# Altium footprint library LimeMicroAltiumLib_pcbLib.PcbLib: 281 footprints (part 10 of 18)
Each footprint in its own frame and in the unit in brackets; x right, y up, seen from the top. Pads: shape width x height; smd on the part's side, far side on the other; paste and mask are expansions set on the pad; w line width, h text height; cw(c..) or ccw(c..) is an arc to the next point about the centre after c.
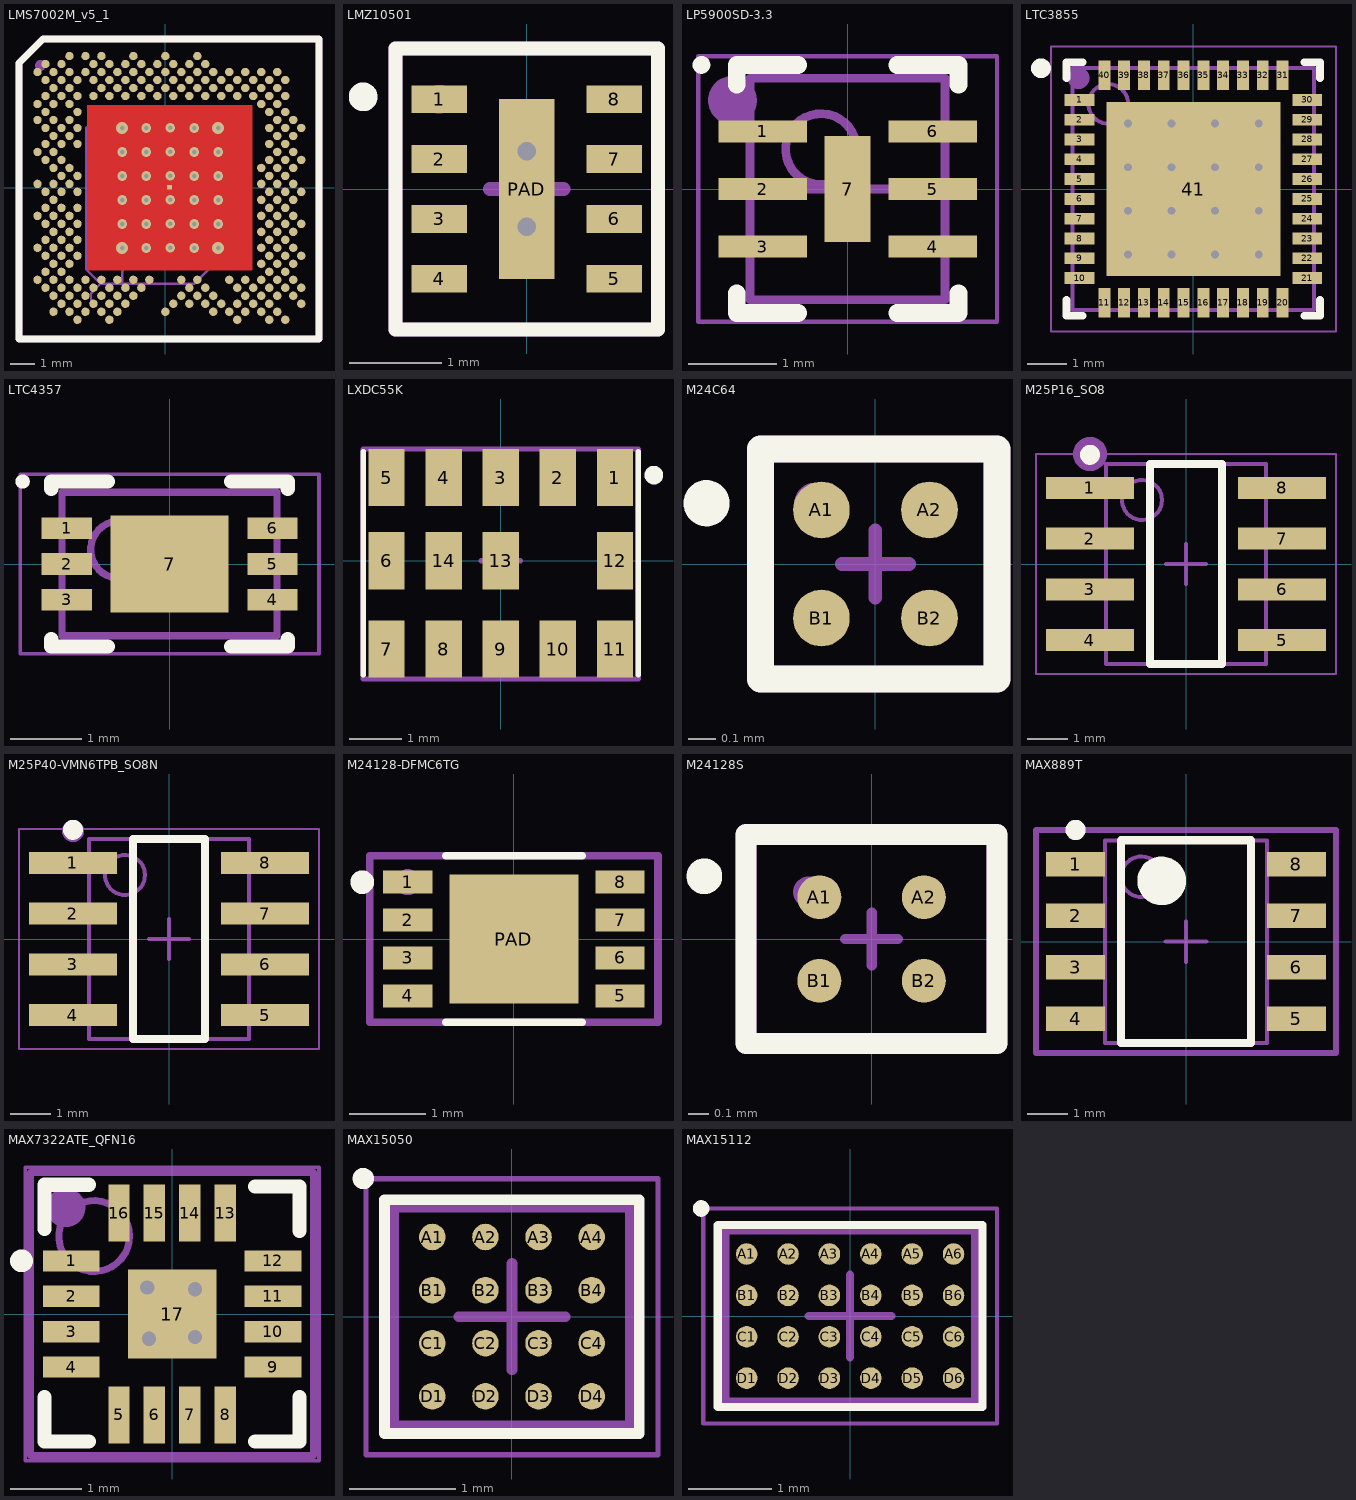
[diagram p9: the footprints below, top view; thin cyan lines are the x and y axes]

## LMS7002M_v5_1 [mm] "LMS7002 without AM2 pad (internally unconnected). center pad soldermask reduced to fit 0.18mm tolerance"
pads (261):
  round 0.35 smd mask+0: A5(-3.998,5.49) A7(-3.332,5.49) A9(-2.666,5.49) A13(-1.334,5.49) A17(-0.002,5.49) A21(1.33,5.49) AA1(-5.33,-1.17) AA3(-4.664,-1.17) AA5(-3.998,-1.17) AA29(3.994,-1.17) AA31(4.66,-1.17) AA33(5.326,-1.17) AB2(-4.997,-1.503) AB4(-4.331,-1.503) AB6(-3.665,-1.503) AB30(4.327,-1.503) AB32(4.993,-1.503) AB34(5.659,-1.503) AC3(-4.664,-1.836) AC5(-3.998,-1.836) AC29(3.994,-1.836) AC31(4.66,-1.836) AC33(5.326,-1.836) AD2(-4.997,-2.169) AD4(-4.331,-2.169) AD6(-3.665,-2.169) AD30(4.327,-2.169) AD32(4.993,-2.169) AE1(-5.33,-2.502) AE3(-4.664,-2.502) AE5(-3.998,-2.502) AE29(3.994,-2.502) AE31(4.66,-2.502) AE33(5.326,-2.502) AF2(-4.997,-2.835) AF4(-4.331,-2.835) AF6(-3.665,-2.835) AF30(4.327,-2.835) AF32(4.993,-2.835) AF34(5.659,-2.835) AG3(-4.664,-3.168) AG5(-3.998,-3.168) AG29(3.994,-3.168) AG31(4.66,-3.168) AG33(5.326,-3.168) AH2(-4.997,-3.501) AH4(-4.331,-3.501) AH30(4.327,-3.501) AH32(4.993,-3.501) AJ1(-5.33,-3.834) AJ3(-4.664,-3.834) AJ5(-3.998,-3.834) AJ7(-3.332,-3.834) AJ9(-2.666,-3.834) AJ11(-2,-3.834) AJ13(-1.334,-3.834) AJ15(-0.668,-3.834) AJ19(0.664,-3.834) AJ21(1.33,-3.834) AJ25(2.662,-3.834) AJ27(3.328,-3.834) AJ29(3.994,-3.834) AJ31(4.66,-3.834) AJ33(5.326,-3.834) AK2(-4.997,-4.167) AK4(-4.331,-4.167) AK6(-3.665,-4.167) AK8(-2.999,-4.167) AK10(-2.333,-4.167) AK12(-1.667,-4.167) AK14(-1.001,-4.167) AK20(0.997,-4.167) AK22(1.663,-4.167) AK26(2.995,-4.167) AK28(3.661,-4.167) AK30(4.327,-4.167) AK32(4.993,-4.167) AK34(5.659,-4.167) AL3(-4.664,-4.5) AL5(-3.998,-4.5) AL7(-3.332,-4.5) AL9(-2.666,-4.5) AL11(-2,-4.5) AL13(-1.334,-4.5) AL19(0.664,-4.5) AL21(1.33,-4.5) AL23(1.996,-4.5) AL27(3.328,-4.5) AL29(3.994,-4.5) AL31(4.66,-4.5) AL33(5.326,-4.5) AM4(-4.331,-4.833) AM6(-3.665,-4.833) AM8(-2.999,-4.833) AM10(-2.333,-4.833) AM12(-1.667,-4.833) AM18(0.331,-4.833) AM20(0.997,-4.833) AM22(1.663,-4.833) AM24(2.329,-4.833) AM26(2.995,-4.833) AM28(3.661,-4.833) AM30(4.327,-4.833) AM34(5.659,-4.833) AN3(-4.664,-5.166) AN5(-3.998,-5.166) AN7(-3.332,-5.166) AN9(-2.666,-5.166) AN11(-2,-5.166) AN17(-0.002,-5.166) AN23(1.996,-5.166) AN25(2.662,-5.166) AN27(3.328,-5.166) AN29(3.994,-5.166) AN31(4.66,-5.166) AP6(-3.665,-5.499) AP10(-2.333,-5.499) AP26(2.995,-5.499) AP30(4.327,-5.499) AP32(4.993,-5.499) B2(-4.997,5.157) B4(-4.331,5.157) B8(-2.999,5.157) B10(-2.333,5.157) B12(-1.667,5.157) B14(-1.001,5.157) B16(-0.335,5.157) B18(0.331,5.157) B20(0.997,5.157) B22(1.663,5.157) C1(-5.33,4.824) C3(-4.664,4.824) C5(-3.998,4.824) C7(-3.332,4.824) C9(-2.666,4.824) C11(-2,4.824) C13(-1.334,4.824) C15(-0.668,4.824) C17(-0.002,4.824) C19(0.664,4.824) C21(1.33,4.824) C23(1.996,4.824) C25(2.662,4.824) C27(3.328,4.824) C29(3.994,4.824) C31(4.66,4.824) D2(-4.997,4.491) D4(-4.331,4.491) D6(-3.665,4.491) D8(-2.999,4.491) D10(-2.333,4.491) D12(-1.667,4.491) D14(-1.001,4.491) D16(-0.335,4.491) D18(0.331,4.491) D20(0.997,4.491) D22(1.663,4.491) D24(2.329,4.491) D26(2.995,4.491) D28(3.661,4.491) D30(4.327,4.491) D32(4.993,4.491) E3(-4.664,4.158) E5(-3.998,4.158) E9(-2.666,4.158) E11(-2,4.158) E13(-1.334,4.158) E15(-0.668,4.158) E17(-0.002,4.158) E19(0.664,4.158) E21(1.33,4.158) E23(1.996,4.158) E25(2.662,4.158) E27(3.328,4.158) E29(3.994,4.158) E31(4.66,4.158) F2(-4.997,3.825) F4(-4.331,3.825) F6(-3.665,3.825) F8(-2.999,3.825) F10(-2.333,3.825) F12(-1.667,3.825) F14(-1.001,3.825) F16(-0.335,3.825) F18(0.331,3.825) F20(0.997,3.825) F22(1.663,3.825) F24(2.329,3.825) F26(2.995,3.825) F28(3.661,3.825) F30(4.327,3.825) F32(4.993,3.825) G1(-5.33,3.492) G3(-4.664,3.492) G5(-3.998,3.492) G29(3.994,3.492) G31(4.66,3.492) H2(-4.997,3.159) H6(-3.665,3.159) H30(4.327,3.159) H32(4.993,3.159) J1(-5.33,2.826) J3(-4.664,2.826) J5(-3.998,2.826) J31(4.66,2.826) J33(5.326,2.826) K2(-4.997,2.493) K4(-4.331,2.493) K6(-3.665,2.493) K30(4.327,2.493) K32(4.993,2.493) K34(5.659,2.493) L3(-4.664,2.16) L5(-3.998,2.16) L31(4.66,2.16) L33(5.326,2.16) M2(-4.997,1.827) M4(-4.331,1.827) M6(-3.665,1.827) M30(4.327,1.827) M32(4.993,1.827) N1(-5.33,1.494) N3(-4.664,1.494) N31(4.66,1.494) N33(5.326,1.494) P2(-4.997,1.161) P4(-4.331,1.161) P30(4.327,1.161) P32(4.993,1.161) P34(5.659,1.161) R3(-4.664,0.828) R5(-3.998,0.828) R29(3.994,0.828) R31(4.66,0.828) R33(5.326,0.828) T4(-4.331,0.495) T6(-3.665,0.495) T30(4.327,0.495) T32(4.993,0.495) U1(-5.33,0.162) U3(-4.664,0.162) U5(-3.998,0.162) U29(3.994,0.162) U31(4.66,0.162) U33(5.326,0.162) V2(-4.997,-0.171) V4(-4.331,-0.171) V6(-3.665,-0.171) V30(4.327,-0.171) V32(4.993,-0.171) V34(5.659,-0.171) W3(-4.664,-0.504) W29(3.994,-0.504) W31(4.66,-0.504) W33(5.326,-0.504) Y2(-4.997,-0.837) Y4(-4.331,-0.837) Y6(-3.665,-0.837) Y30(4.327,-0.837) Y32(4.993,-0.837)
  rect 0.2x0.2 smd: GND(0.175,0.025)
via 1.2,2.49 diameter 0.4 hole 0.2
via 1.2,1.49 diameter 0.4 hole 0.2
via 1.2,-0.51 diameter 0.4 hole 0.2
via 1.2,0.49 diameter 0.4 hole 0.2
via 1.2,-2.51 diameter 0.4 hole 0.2
via 1.2,-1.51 diameter 0.4 hole 0.2
via 2.2,2.49 diameter 0.5 hole 0.2
via 2.2,1.49 diameter 0.4 hole 0.2
via 2.2,-0.51 diameter 0.4 hole 0.2
via 2.2,0.49 diameter 0.4 hole 0.2
via 2.2,-2.51 diameter 0.5 hole 0.2
via 2.2,-1.51 diameter 0.4 hole 0.2
via -1.8,-1.51 diameter 0.4 hole 0.2
via -1.8,-2.51 diameter 0.5 hole 0.2
via -1.8,0.49 diameter 0.4 hole 0.2
via -1.8,-0.51 diameter 0.4 hole 0.2
via -1.8,1.49 diameter 0.4 hole 0.2
via -1.8,2.49 diameter 0.5 hole 0.2
via -0.8,-1.51 diameter 0.4 hole 0.2
via -0.8,-2.51 diameter 0.4 hole 0.2
via -0.8,0.49 diameter 0.4 hole 0.2
via -0.8,-0.51 diameter 0.4 hole 0.2
via -0.8,1.49 diameter 0.4 hole 0.2
via -0.8,2.49 diameter 0.4 hole 0.2
via 0.2,2.5 diameter 0.4 hole 0.2
via 0.2,1.5 diameter 0.4 hole 0.2
via 0.2,-0.5 diameter 0.4 hole 0.2
via 0.2,0.5 diameter 0.4 hole 0.2
via 0.2,-2.5 diameter 0.4 hole 0.2
via 0.2,-1.5 diameter 0.4 hole 0.2
Top Layer:
  rectangle: -3.275,-3.45 3.625,3.45
Top Overlay:
  lines w0.3: -6.1,-6.3 6.4,-6.3 6.4,6.2 -5.1,6.2 -6.1,5.2 -6.1,-6.3
Top Paste:
  drawing of 45 lines, arcs and shapes, not listed
Top Solder:
  rectangle: -3.275,-3.45 3.625,3.45
Mechanical 1:
  lines w0.1: -3.1,-4.7 -3.1,-4.4 -2.7,-4 ; -2.083,2.49 -1.8,2.49 ; -2,-2.71 -1.8,-2.51 ; -1.8,2.207 -1.8,2.49 ; -1.6,-2.71 -1.8,-2.51 ; 1.917,2.49 2.2,2.49 ; 2,-2.71 2.2,-2.51 ; 2.2,2.773 2.2,2.49 ; 2.4,-2.71 2.2,-2.51 ; -3.3,0.99 -3.3,2.5 -2.7,3.1 1.59,3.1 2.2,2.49 ; -3.3,0.99 -1.8,2.49 ; -3.3,0.99 -3.3,-3.4 -2.7,-4 ; -2.7,-4 -1.8,-4 ; -1.8,-4 1.2,-4 1.5,-3.7 2.2,-3 2.2,-2.51 ; -1.8,-4 -1.8,-2.51
  text "0.2mm/0.5mm hole/ring vias under   / pad to be left open (no metal cap)" at -6.6,-6.8 h0.35
Mechanical 15:
  circle w0.35: c-5.2,5.1 r0.05
  lines w0.1: -0.775,0 0,0 ; 0,-0.775 0,0 ; 0,0.775 0,0 ; 0.775,0 0,0
  lines w0.3: -6.1,-6.3 6.4,-6.3 6.4,6.2 -5.1,6.2 -6.1,5.2 -6.1,-6.3
  text "Footprint revision: r5.1" at -2.975,-6.075 h0.4
  text "Pad size = 0.35mm / Pad paste mask = 0.35mm / No AM2 pad" at -5.6,-4.25 h0.4
  text "1) paste/pad ratio ~60% / 2) 4 thermal pad vias  / without metal cap / 3) all other thermal pad  / vias with metal cap / 4) thermal pad reduced to / meet minimum 0.18mm soldermask / silver" at -5.775,-1.35 h0.4
  text ".Designator" at 0,0 h0.55
3D body "LMS7002M_11p5x11p5.STEP": height 0.97, standoff 0.03, extent -5.6,-5.75 5.9,5.75

## LMZ10501 [mm] "LMZ10501"
pads (9):
  rect 0.6x0.3 smd mask+0.07: 1(-0.95,0.975) 2(-0.95,0.325) 3(-0.95,-0.325) 4(-0.95,-0.975) 5(0.95,-0.975) 6(0.95,-0.325) 7(0.95,0.325) 8(0.95,0.975)
  rect 0.6x1.95 smd mask+0.07: PAD(0,0)
via 0,0.41 diameter 0.4 hole 0.2
via 0,-0.41 diameter 0.4 hole 0.2
Top Overlay:
  circle w0.2: c-1.775,1 r0.056
  lines w0.15: -1.425,-1.525 -1.425,1.525 1.425,1.525 1.425,-1.525 -1.425,-1.525
Mechanical 15:
  circle w0.2: c-0.95,0.975 r0.056
  lines w0.15: -0.4,0 0,0 ; 0,-0.4 0,0 ; 0,0.4 0,0 ; 0.4,0 0,0 ; -1.425,-1.525 -1.425,1.525 1.425,1.525 1.425,-1.525 -1.425,-1.525
  text ".Designator" at 0,0 h0.55
3D body: height 0.41, standoff 0, extent -1.313,-1.525 1.312,1.525
3D body: height 1.5, standoff 0.5, extent -0.8,-1 0.8,1

## LP5900SD-3.3 [mm] "SON, 6-Leads, Body 2,50x2,20mm, Pitch 0,65mm, Thermal Pad 1,20x0,52mm, IPC Medium Density"
height 0.8
pads (7):
  rect 1x0.25 smd mask+0.05: 1(-0.96,0.65) 2(-0.96,0) 3(-0.96,-0.65) 4(0.96,-0.65) 5(0.96,0) 6(0.96,0.65)
  rect 0.52x1.2 smd mask+0.05: 7(0,0)
Top Overlay:
  circle w0.1: c-1.65,1.4 r0.05
  lines w0.2: -1.25,-1.175 -1.25,-1.4 -0.56,-1.4 ; -1.25,1.175 -1.25,1.4 -0.56,1.4 ; 0.56,-1.4 1.25,-1.4 1.25,-1.175 ; 0.56,1.4 1.25,1.4 1.25,1.175
Mechanical 13:
  circle w0.1: c-0.3,0.45 r0.4
  lines w0.1: -1.1,-1.25 1.1,-1.25 1.1,1.25 -1.1,1.25 -1.1,-1.25
Mechanical 15:
  circle w0.35: c-1.3,1 r0.1
  lines w0.05: -1.685,-1.5 1.685,-1.5 1.685,1.5 -1.685,1.5 -1.685,-1.5
  lines w0.1: -0.5,0 0.5,0 ; 0,-0.5 0,0.5
  text ".Designator" at 0,0 h0.7
3D body: height 0.8, standoff 0.1, extent -1.1,-1.25 1.1,1.25

## LTC3855 [mm] "QFN, 40-Leads, Body 6,00x6,00mm, Pitch 0,50mm, Thermal Pad 4,40x4,40mm, IPC Medium Density"
height 0.8
pads (41):
  rect 0.75x0.3 smd mask+0.05: 1(-2.875,2.25) 2(-2.875,1.75) 3(-2.875,1.25) 4(-2.875,0.75) 5(-2.875,0.25) 6(-2.875,-0.25) 7(-2.875,-0.75) 8(-2.875,-1.25) 9(-2.875,-1.75) 10(-2.875,-2.25) 21(2.875,-2.25) 22(2.875,-1.75) 23(2.875,-1.25) 24(2.875,-0.75) 25(2.875,-0.25) 26(2.875,0.25) 27(2.875,0.75) 28(2.875,1.25) 29(2.875,1.75) 30(2.875,2.25)
  rect 0.3x0.75 smd mask+0.05: 11(-2.25,-2.875) 12(-1.75,-2.875) 13(-1.25,-2.875) 14(-0.75,-2.875) 15(-0.25,-2.875) 16(0.25,-2.875) 17(0.75,-2.875) 18(1.25,-2.875) 19(1.75,-2.875) 20(2.25,-2.875) 31(2.25,2.875) 32(1.75,2.875) 33(1.25,2.875) 34(0.75,2.875) 35(0.25,2.875) 36(-0.25,2.875) 37(-0.75,2.875) 38(-1.25,2.875) 39(-1.75,2.875) 40(-2.25,2.875)
  rect 4.4x4.4 smd mask+0.05: 41(0,0)
via -1.65,1.65 diameter 0.4 hole 0.2
via -0.55,1.65 diameter 0.4 hole 0.2
via 0.55,1.65 diameter 0.4 hole 0.2
via 1.65,1.65 diameter 0.4 hole 0.2
via -1.65,0.55 diameter 0.4 hole 0.2
via -0.55,0.55 diameter 0.4 hole 0.2
via 0.55,0.55 diameter 0.4 hole 0.2
via 1.65,0.55 diameter 0.4 hole 0.2
via -1.65,-0.55 diameter 0.4 hole 0.2
via -0.55,-0.55 diameter 0.4 hole 0.2
via 0.55,-0.55 diameter 0.4 hole 0.2
via 1.65,-0.55 diameter 0.4 hole 0.2
via -1.65,-1.65 diameter 0.4 hole 0.2
via -0.55,-1.65 diameter 0.4 hole 0.2
via 0.55,-1.65 diameter 0.4 hole 0.2
via 1.65,-1.65 diameter 0.4 hole 0.2
Top Overlay:
  circle w0.25: c-3.85,3.05 r0.125
  lines w0.2: -3.2,-2.8 -3.2,-3.2 -2.8,-3.2 ; -3.2,2.8 -3.2,3.2 -2.8,3.2 ; 2.8,-3.2 3.2,-3.2 3.2,-2.8 ; 2.8,3.2 3.2,3.2 3.2,2.8
Mechanical 13:
  circle w0.1: c-2.15,2.15 r0.5
  lines w0.1: -3.05,-3.05 -3.05,3.05 3.05,3.05 3.05,-3.05 -3.05,-3.05
Mechanical 15:
  circle w0.35: c-2.9,2.8 r0.1
  lines w0.05: -3.6,-3.6 -3.6,3.6 3.6,3.6 3.6,-3.6 -3.6,-3.6
  lines w0.1: -0.5,0 0.5,0 ; 0,-0.5 0,0.5
  text ".Designator" at 0,0 h0.7
3D body "User Library-QFN40.step": height 0.8, standoff 0, extent -3,-3 3,3

## LTC4357 [mm] "SON, 6-Leads, Body 2,00x3,00mm, Pitch 0,50mm, Thermal Pad 1,35x1,12mm, IPC Medium Density"
height 0.8
pads (7):
  rect 0.7x0.3 smd mask+0.05: 1(-1.435,0.5) 2(-1.435,0) 3(-1.435,-0.5) 4(1.435,-0.5) 5(1.435,0) 6(1.435,0.5)
  rect 1.65x1.35 smd mask+0.05: 7(0,0)
Top Overlay:
  circle w0.1: c-2.05,1.15 r0.05
  lines w0.2: -1.65,-1.05 -1.65,-1.15 -0.86,-1.15 ; -1.65,1.05 -1.65,1.15 -0.86,1.15 ; 0.86,-1.15 1.65,-1.15 1.65,-1.05 ; 0.86,1.15 1.65,1.15 1.65,1.05
Mechanical 13:
  circle w0.1: c-0.7,0.2 r0.4
  lines w0.1: -1.5,-1 1.5,-1 1.5,1 -1.5,1 -1.5,-1
Mechanical 15:
  lines w0.05: -2.085,-1.25 2.085,-1.25 2.085,1.25 -2.085,1.25 -2.085,-1.25
  lines w0.1: -0.5,0 0.5,0 ; 0,-0.5 0,0.5
  text ".Designator" at 0,-0.1 h0.7
3D body: height 0.8, standoff 0.2, extent -1.5,-1 1.5,1

## LXDC55K [mm] "LXDC55K"
pads (14):
  rect 0.7x1.1 smd mask+0.05: 1(2.2,1.6) 2(1.1,1.6) 3(0,1.6) 4(-1.1,1.6) 5(-2.2,1.6) 6(-2.2,0) 7(-2.2,-1.7) 8(-1.1,-1.7) 9(0,-1.7) 10(1.1,-1.7) 11(2.2,-1.7) 12(2.2,0) 13(0,0) 14(-1.1,0)
Top Overlay:
  circle w0.2: c2.95,1.65 r0.079
  lines w0.1: -2.65,-2.2 -2.65,2.1 ; 2.65,-2.2 2.65,2.1
Mechanical 15:
  circle w0.2: c2.2,1.625 r0.079
  lines w0.1: -0.375,0 0,0 ; 0,-0.375 0,0 ; 0,0.375 0,0 ; 0.375,0 0,0 ; -2.65,-2.275 -2.65,2.15 2.65,2.15 2.65,-2.275 -2.65,-2.275
  text ".Designator" at 0,0 h0.55
3D body: height 2.1, standoff 0, extent -2.85,-2.5 2.85,2.5

## M24C64 [mm]
pads (4):
  round 0.21 smd mask+0.05: A1(-0.2,0.2) A2(0.2,0.2) B1(-0.2,-0.2) B2(0.2,-0.2)
Top Overlay:
  circle w0.1: c-0.625,0.225 r0.035
  lines w0.1: -0.425,-0.425 -0.425,0.425 0.45,0.425 0.45,-0.425 -0.425,-0.425
Mechanical 15:
  circle w0.1: c-0.225,0.225 r0.025
  lines w0.05: -0.125,0 0,0 ; 0,-0.125 0,0 ; 0,0.125 0,0 ; 0.125,0 0,0
  lines w0.1: -0.425,-0.425 -0.425,0.425 0.45,0.425 0.45,-0.425 -0.425,-0.425
  text ".Designator" at 0,0 h0.55
3D body: height 0.33, standoff 0.32, extent -0.25,0.15 -0.15,0.25
3D body: height 0.32, standoff 0, extent -0.412,-0.35 0.413,0.35

## M25P16_SO8 [mm] "SOIC, 8-Leads, Body 4,90x3,90mm, Pitch 1,27mm, IPC Medium Density"
height 1.7
pads (8):
  rect 2.2x0.55 smd: 1(-2.4,1.905) 2(-2.4,0.635) 3(-2.4,-0.635) 4(-2.4,-1.905) 5(2.4,-1.905) 6(2.4,-0.635) 7(2.4,0.635) 8(2.4,1.905)
Top Overlay:
  circle w0.25: c-2.4,2.73 r0.125
  lines w0.2: -0.9,-2.5 0.9,-2.5 0.9,2.5 -0.9,2.5 -0.9,-2.5
Mechanical 13:
  circle w0.1: c-1.1,1.6 r0.5
  lines w0.1: -2,-2.5 2,-2.5 2,2.5 -2,2.5 -2,-2.5
Mechanical 15:
  circle w0.35: c-2.4,2.75 r0.25
  lines w0.05: -3.75,-2.75 3.75,-2.75 3.75,2.75 -3.75,2.75 -3.75,-2.75
  lines w0.1: -0.5,0 0.5,0 ; 0,-0.5 0,0.5
  text ".Designator" at 0,0 h0.7
3D body "CircuitWorks-SO-8.step": height 1.45, standoff 0, extent -2.889,-2.45 2.889,2.452

## M25P40-VMN6TPB_SO8N [mm] "SOIC, 8-Leads, Body 4,90x3,90mm, Pitch 1,27mm, IPC Medium Density"
height 1.7
pads (8):
  rect 2.2x0.55 smd: 1(-2.4,1.905) 2(-2.4,0.635) 3(-2.4,-0.635) 4(-2.4,-1.905) 5(2.4,-1.905) 6(2.4,-0.635) 7(2.4,0.635) 8(2.4,1.905)
Top Overlay:
  circle w0.25: c-2.4,2.73 r0.125
  lines w0.2: -0.9,-2.5 0.9,-2.5 0.9,2.5 -0.9,2.5 -0.9,-2.5
Mechanical 13:
  circle w0.1: c-1.1,1.6 r0.5
  lines w0.1: -2,-2.5 2,-2.5 2,2.5 -2,2.5 -2,-2.5
Mechanical 15:
  circle w0.35: c-2.4,2.7 r0.1
  lines w0.05: -3.75,-2.75 3.75,-2.75 3.75,2.75 -3.75,2.75 -3.75,-2.75
  lines w0.1: -0.5,0 0.5,0 ; 0,-0.5 0,0.5
  text ".Designator" at 0,0 h0.7
3D body "CircuitWorks-SO-8.step": height 1.45, standoff 0, extent -2.889,-2.45 2.889,2.452

## M24128-DFMC6TG [mm] "8-UFDFPN (2x3)"
pads (9):
  rect 0.65x0.3 smd mask+0.05: 1(-1.4,0.75) 2(-1.4,0.25) 3(-1.4,-0.25) 4(-1.4,-0.75) 5(1.4,-0.75) 6(1.4,-0.25) 7(1.4,0.25) 8(1.4,0.75)
  rect 1.7x1.7 smd mask+0.05: PAD(0,0)
Top Overlay:
  circle w0.2: c-2,0.75 r0.056
  lines w0.1: -0.9,-1.1 0.9,-1.1 ; -0.9,1.1 0.9,1.1
Mechanical 15:
  circle w0.2: c-1.4,0.75 r0.071
  lines w0.1: -0.3,0 0,0 ; 0,-0.3 0,0 ; 0,0.3 0,0 ; 0.3,0 0,0 ; -1.9,-1.1 1.9,-1.1 1.9,1.1 -1.9,1.1 -1.9,-1.1
  text ".Designator" at 0,0 h0.55
3D body "User Library-DFN-8-2.step": height 0.9, standoff 0, extent -1.523,-1.006 1.517,0.994

## M24128S [mm]
pads (4):
  round 0.21 smd mask+0.05: A1(-0.25,0.2) A2(0.25,0.2) B1(-0.25,-0.2) B2(0.25,-0.2)
Top Overlay:
  circle w0.1: c-0.8,0.3 r0.035
  lines w0.1: -0.6,-0.5 -0.6,0.5 0.6,0.5 0.6,-0.5 -0.6,-0.5
Mechanical 15:
  circle w0.1: c-0.3,0.225 r0.025
  lines w0.05: -0.125,0 0,0 ; 0,-0.125 0,0 ; 0,0.125 0,0 ; 0.125,0 0,0
  lines w0.1: -0.6,-0.5 0.6,-0.5 0.6,0.5 -0.6,0.5 -0.6,-0.5
  text ".Designator" at 0,0 h0.55
3D body: height 0.33, standoff 0.32, extent -0.25,0.15 -0.15,0.25
3D body: height 0.32, standoff 0, extent -0.412,-0.35 0.413,0.35

## MAX889T [mm] "SOIC, 8-Leads, Body 4,90x3,90mm, Pitch 1,27mm, IPC Medium Density"
height 1.75
pads (8):
  rect 1.45x0.6 smd: 1(-2.725,1.905) 2(-2.725,0.635) 3(-2.725,-0.635) 4(-2.725,-1.905) 5(2.725,-1.905) 6(2.725,-0.635) 7(2.725,0.635) 8(2.725,1.905)
Top Overlay:
  circle w0.6: c-0.6,1.5 r0.3
  circle w0.25: c-2.725,2.755 r0.125
  lines w0.2: -1.6,-2.5 1.6,-2.5 1.6,2.5 -1.6,2.5 -1.6,-2.5
Mechanical 13:
  circle w0.1: c-1.1,1.6 r0.5
  lines w0.1: -2,-2.5 2,-2.5 2,2.5 -2,2.5 -2,-2.5
Mechanical 15:
  circle w0.25: c-2.725,1.905 r0.125
  lines w0.1: -0.5,0 0.5,0 ; 0,-0.5 0,0.5
  lines w0.15: -3.7,-2.75 3.7,-2.75 3.7,2.75 -3.7,2.75 -3.7,-2.75
  text ".Designator" at -0.05,0 h0.7
3D body "SOIC-8.STEP": height 1.75, standoff 0, extent -3,-2.45 3,2.45

## MAX7322ATE_QFN16 [mm]
height 0.8
pads (17):
  rect 0.8x0.3 smd mask+0.05: 1(-1.425,0.75) 2(-1.425,0.25) 3(-1.425,-0.25) 4(-1.425,-0.75) 9(1.425,-0.75) 10(1.425,-0.25) 11(1.425,0.25) 12(1.425,0.75)
  rect 0.3x0.8 smd mask+0.05: 5(-0.75,-1.425) 6(-0.25,-1.425) 7(0.25,-1.425) 8(0.75,-1.425) 13(0.75,1.425) 14(0.25,1.425) 15(-0.25,1.425) 16(-0.75,1.425)
  rect 1.25x1.25 smd mask+0.05: 17(0,0)
via -0.35,0.375 diameter 0.4 hole 0.2
via 0.325,0.35 diameter 0.4 hole 0.2
via 0.325,-0.325 diameter 0.4 hole 0.2
via -0.325,-0.35 diameter 0.4 hole 0.2
Top Overlay:
  circle w0.25: c-2.125,0.75 r0.035
  lines w0.2: -1.8,-1.175 -1.8,-1.8 -1.175,-1.8 ; -1.8,1.2 -1.8,1.825 -1.175,1.825 ; 1.175,-1.8 1.8,-1.8 1.8,-1.175 ; 1.175,1.8 1.8,1.8 1.8,1.175
Mechanical 13:
  circle w0.1: c-1.1,1.1 r0.5
  lines w0.1: -2,-2 2,-2 2,2 -2,2 -2,-2
Mechanical 15:
  circle w0.35: c-1.5,1.5 r0.1
  lines w0.05: -2.075,-2.075 2.075,-2.075 2.075,2.075 -2.075,2.075 -2.075,-2.075
  lines w0.1: -0.5,0 0.5,0 ; 0,-0.5 0,0.5
  text ".Designator" at 0,0 h0.7
3D body "User Library-qfn16-3x3.step": height 0.92, standoff 0, extent -1.5,-1.5 1.5,1.5

## MAX15050 [mm] "BGA, 16-Leads, Body 2,22x2,06mmx0,25mm, Pitch 0,50mm"
height 0.25
pads (16):
  round 0.25 smd: A1(-0.75,0.75) A2(-0.25,0.75) A3(0.25,0.75) A4(0.75,0.75) B1(-0.75,0.25) B2(-0.25,0.25) B3(0.25,0.25) B4(0.75,0.25) C1(-0.75,-0.25) C2(-0.25,-0.25) C3(0.25,-0.25) C4(0.75,-0.25) D1(-0.75,-0.75) D2(-0.25,-0.75) D3(0.25,-0.75) D4(0.75,-0.75)
Top Overlay:
  circle w0.1: c-1.4,1.3 r0.05
  lines w0.1: -1.2,-1.1 -1.2,1.1 1.2,1.1 1.2,-1.1 -1.2,-1.1
Mechanical 13:
  lines w0.1: -1.115,-1.03 -1.115,1.03 1.115,1.03 1.115,-1.03 -1.115,-1.03
Mechanical 15:
  lines w0.05: -1.375,-1.3 -1.375,1.3 1.375,1.3 1.375,-1.3 -1.375,-1.3
  lines w0.1: -0.5,0 0.5,0 ; 0,-0.5 0,0.5
  text ".Designator" at 0,0 h0.7
3D body: height 0.25, standoff 0.25, extent -1.115,-1.03 1.115,1.03

## MAX15112 [mm] "BGA, 24-Leads, Body 3,02x2,07mmx0,25mm, Pitch 0,50mm"
height 0.25
pads (24):
  round 0.26 smd: A1(-1.25,0.75) A2(-0.75,0.75) A3(-0.25,0.75) A4(0.25,0.75) A5(0.75,0.75) A6(1.25,0.75) B1(-1.25,0.25) B2(-0.75,0.25) B3(-0.25,0.25) B4(0.25,0.25) B5(0.75,0.25) B6(1.25,0.25) C1(-1.25,-0.25) C2(-0.75,-0.25) C3(-0.25,-0.25) C4(0.25,-0.25) C5(0.75,-0.25) C6(1.25,-0.25) D1(-1.25,-0.75) D2(-0.75,-0.75) D3(-0.25,-0.75) D4(0.25,-0.75) D5(0.75,-0.75) D6(1.25,-0.75)
Top Overlay:
  circle w0.1: c-1.8,1.3 r0.05
  lines w0.1: -1.6,-1.1 -1.6,1.1 1.6,1.1 1.6,-1.1 -1.6,-1.1
Mechanical 13:
  lines w0.1: -1.51,-1.035 -1.51,1.035 1.51,1.035 1.51,-1.035 -1.51,-1.035
Mechanical 15:
  lines w0.05: -1.775,-1.3 -1.775,1.3 1.775,1.3 1.775,-1.3 -1.775,-1.3
  lines w0.1: -0.5,0 0.5,0 ; 0,-0.5 0,0.5
  text ".Designator" at 0,0 h0.7
3D body: height 0.25, standoff 0.25, extent -1.51,-1.035 1.51,1.035

## MECH_JUMPER_HALF_PITCH [mm]
3D body "User Library-PinHeader50mil.STEP": height 7.3, standoff 1.8, extent -1.25,-0.575 1.25,0.625